# Altium schematic symbol library Schlib.SchLib: 725 symbols (part 1 of 6) (continued)
## 2309407-1
designator J?
260 Position SODIMM DDR4 SDRAM Socket Surface Mount, 25° Angle; Manufacturer: TE Connectivity; Manufacturer Part Number: 2309407-1; Supplier: Rs; Supplier Part Number: 1855885P; RoHS: Yes; Category: Memory Connectors; Stock: 175; Pricing: 25=1.41400, 50=1.35400, 100=1.24800 (GBP); ComponentLink1URL: https://www.te.com/commerce/DocumentDelivery/DDEController?Action=srchrtrv&DocNm=2309413&DocType=Customer+Drawing&DocLang=English&src-supplier=Digi-Key; ComponentLink1Description: https://www.te.com/commerce/DocumentDelivery/DDEController?Action=srchrtrv&DocNm=2309413&DocType=Customer+Drawing&DocLang=English&src-supplier=Digi-Key; ComponentLink2URL: https://www.te.com/commerce/DocumentDelivery/DDEController?Action=srchrtrv&amp;DocNm=2309413&amp;DocType=Customer+Drawing&amp;DocLang=English&src-supplier=Digi-Key; ComponentLink2Description: https://www.te.com/commerce/DocumentDelivery/DDEController?Action=srchrtrv&amp;DocNm=2309413&amp;DocType=Customer+Drawing&amp;DocLang=English&src-supplier=Digi-Key
footprint 2309407-1
part A pins: 1 GND, 2 GND, 7 GND, 8 GND, 13 GND, 14 GND, 19 GND, 20 GND, 25 GND, 26 GND, 31 GND, 32 GND, 37 GND, 38 GND, 43 GND, 44 GND, 49 GND, 50 GND, 55 GND, 56 GND, 61 GND, 62 GND, 67 GND, 68 GND, 73 GND, 74 GND, 79 GND, 80 GND, 85 GND, 86 GND, 99 UART0_TXD, 101 UART0_RXD, 102 GND, 103 UART0_RTS, 105 UART0_CTS, 107 GND, 113 GND, 119 GND, 125 GND, 129 GND, 132 GND, 135 GND, 138 GND, 141 GND, 143 (CAN_RX) RSVD, 144 GND, 145 (CAN_TX) RSVD, 146 GND, 147 GND, 152 GND, 153 GND, 158 GND, 159 GND, 164 GND, 165 GND, 170 GND, 171 GND, 176 GND, 177 GND, 178 MOD_SLEEP, 185 I2C0_SCL, 187 I2C0_SDA, 189 I2C1_SCL, 191 I2C1_SDA, 200 GND, 201 GND, 203 UART1_TXD, 205 UART1_RXD, 207 UART1_RTS, 209 UART1_CTS, 214 FOROE_RECOVERY, 217 GND, 231 GND, 232 I2C2_SCL, 233 SHUTDOWN_REQ, 234 I2C2_SDA, 235 PMI_BBAT, 236 (DEBUG) UART2_TXD, 237 POWER_EN, 238 (DEBUG) UART2_RXD, 239 SYS_RESET, 240 SLEEP/WAKE, 241 GND, 242 GND, 243 GND, 244 GND, 245 GND, 246 GND, 247 GND, 248 GND, 249 GND, 250 GND, 251 VDD_IN, 252 VDD_IN, 253 VDD_IN, 254 VDD_IN, 255 VDD_IN, 256 VDD_IN, 257 VDD_IN, 258 VDD_IN, 259 VDD_IN, 260 VDD_IN, MP1, MP2
part B pins: 3 CSI1_D0-, 4 CSI0_D0-, 5 CSI1_D0+, 6 CSI0_D0+, 9 (CSI1_CLK-) RSVD, 10 CSI0_CLK-, 11 (CSI1_CLK+) RSVD, 12 CSI0_CLK+, 15 CSI1_D1-, 16 CSI0_D1-, 17 CSI1_D1+, 18 CSI0_D1+, 21 CSI3_D0-, 22 CSI2_D0-, 23 CSI3_D0+, 24 CSI2_D0+, 27 CSI3_CLK-, 28 CSI2_CLK-, 29 CSI3_CLK+, 30 CSI2_CLK+, 33 CSI3_D1-, 34 CSI2_D1-, 35 CSI3_D1+, 36 CSI2_D1+, 40 CSI4_D2-, 42 CSI4_D2+, 46 CSI4_D0-, 48 CSI4_D0+, 52 CSI4_CLK-, 54 CSI4_CLK+, 58 CSI4_D1-, 60 CSI4_D1+, 64 CSI4_D3-, 66 CSI4_D3+, 87 GPIO00(USB_VBUS_EN0), 89 SPI0_MOSI, 91 SPI0_SCK, 93 SPI0_MISO, 95 SPI0_CS0, 97 SPI0_CS1, 104 SPI1_MOSI, 106 SPI_SCK, 108 SPI1_MISO, 109 USB0_D-, 110 SPI1_CS0, 111 USB0_D+, 112 SPI1_CS1, 114 CAM0_PWDN, 115 USB1_D-, 116 CAM0_MCLK, 117 USB1_D+, 118 GPIO01 (CLK), 120 CAM1_PWDN, 121 USB2_D-, 122 CAM1_MCLK, 123 USB2_D+, 124 GPIO02, 126 GPIO03, 127 GPIO04, 128 GPIO05, 130 GPIO06, 184 GBE_MDI 0-, 186 GBE_MDI 0+, 188 GBE_LED_LINK, 190 GBE_MDI 1-, 192 GBE_MDI 1+, 193 I2S0_DOUT, 194 GBE_LED_ACT, 195 I2S0_DIN, 196 GBE_MDI 2-, 197 I2S0_FS, 198 GBE_MDI 2+, 199 I2S0_SCLK, 202 GBE_MDI 3-, 204 GBE_MDI 3+, 206 GPIO07 (PWM), 208 GPIO08 (SDMMC_CD), 211 GPIO09 (AUD_MCLK), 212 GPIO10, 213 CAM_I2C_SCL, 215 CAM_I2C_SDA, 216 GPIO11 (CLK), 218 GPIO12, 219 SDMMC_DAT0, 220 I2S1_DOUT, 221 SDMMC_DAT1, 222 I2S1_DIN, 223 SDMMC_DAT2, 224 I2S1_FS, 225 SDMMC_DAT3, 226 I2S1_SCLK, 227 SDMMC_CMD, 228 GPIO13 (PWM), 229 SDMMC_CLK, 230 GPIO14 (PWM)
part C pins: 39 DP0_TXD0-, 41 DP0_TXD0+, 45 DP0_TXD1-, 47 DP0_TXD1+, 51 DP0_TXD2-, 53 DP0_TXD2+, 57 DP0_TXD3-, 59 DP0_TXD3+, 63 DP1_TXD0 (HDMI_TXD2)-, 65 DP1_TXD0 (HDMI_TXD2)+, 69 DP1_TXD1 (HDMI_TXD1)-, 70 DSI_D0-, 71 DP1_TXD1 (HDMI_TXD1)+, 72 DSI_D0+, 75 DP1_TXD2 (HDMI_TXD0)-, 76 DSI_CLK-, 77 DP1_TXD2 (HDMI_TXD0)+, 78 DSI_CLK+, 81 DP1_TXD3 (HDMI_TXC)-, 82 DSI_D1-, 83 DP1_TXD3 (HDMI_TXC)+, 84 DSI_D1+, 88 DP0_HPD, 90 DP0_AUX-, 92 DP0_AUX+, 94 HDMI_CEC, 96 DP1_HPD (HDMI_HPD), 98 DP1_AUX_N (HDMI_DDC_SDA), 100 DP1_AUX_P (HDMI_DDC_SCL), 131 PCIE0_RX0-, 133 PCIE0_RX0+, 134 PCIE0_TX0-, 136 PCIE0_TX0+, 137 PCIE0_RX1-, 139 PCIE0_RX1+, 140 PCIE0_TX1-, 142 PCIE0_TX1+, 148 PCIE0_TX2-, 149 PCIE0_RX2-, 150 PCIE0_TX2+, 151 PCIE0_RX2+, 154 PCIE0_TX3-, 155 PCIE0_RX3-, 156 PCIE0_TX3+, 157 PCIE0_RX3+, 160 PCIE0_CLK-, 161 USBSS_RX-, 162 PCIE0_CLK+, 163 USBSS_RX+, 166 USBSS_TX-, 167 (PCIE1_RX0) RSVD-, 168 USBSS_TX+, 169 (PCIE1_RX0) RSVD+, 172 (PCIE1_TX0) RSVD-, 173 (PCIE1_CLK) RSVD-, 174 (PCIE1_TX0) RSVD+, 175 (PCIE1_CLK) RSVD+, 179 PCIE_WAKE, 180 PCIE0_CLKREQ, 181 PCIE0_RST, 182 (PCIE1_CLKREQ) RSVD, 183 (PCIE1_RST) RSVD, 210 CLK_32K_OUT
part A text: UART, I2C, CAN and GPIOs
part B text: GPIOs, USB2.0, I2S, SPI, GBe and CSI
part C text: HDMI, DP, DSI, USBSS and PCIe

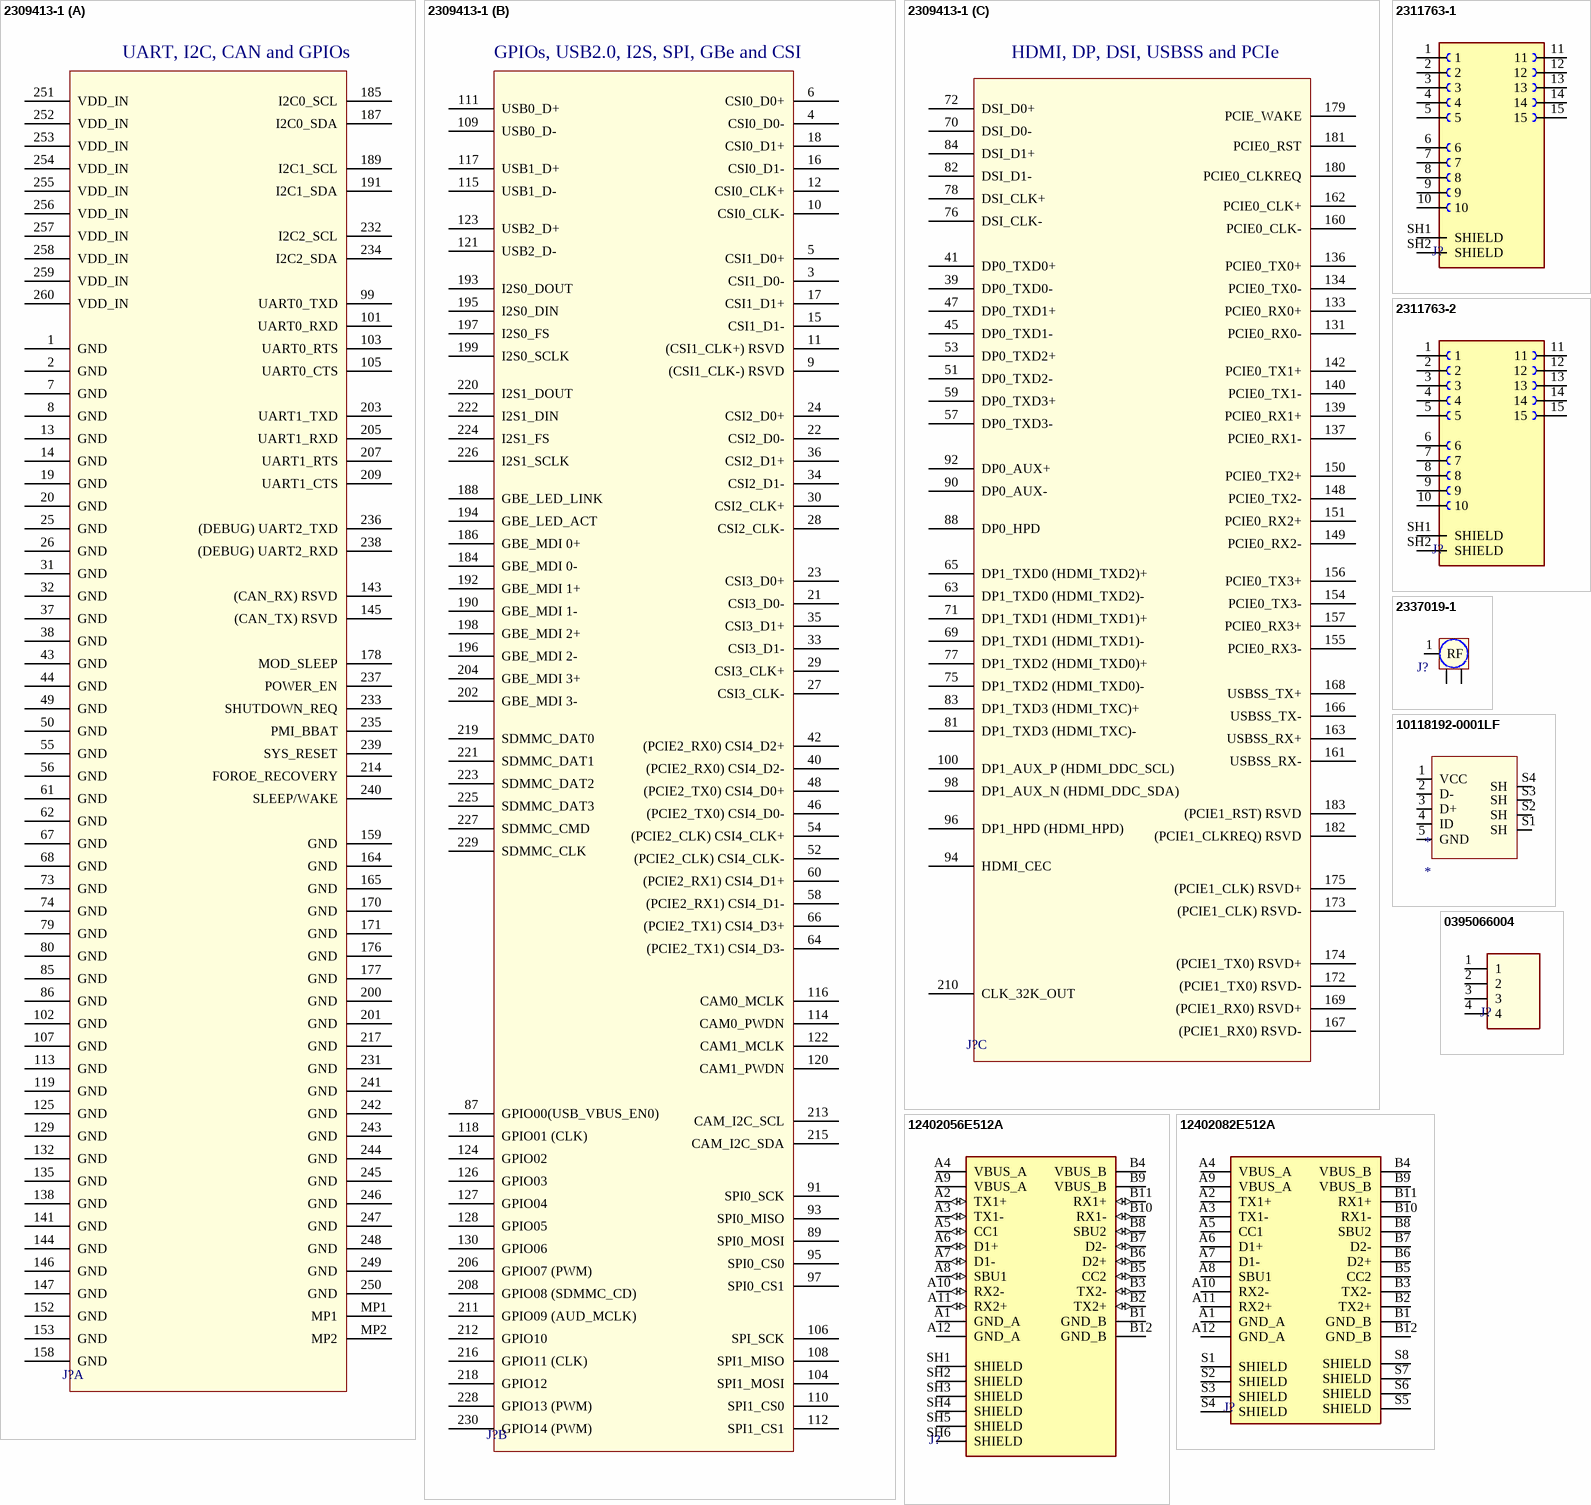
[diagram p3: symbols 2309413-1 to 0395066004]

## 2309413-1
designator J?
Conn DDR4 DIMM Socket SKT 260 POS 0.5mm Solder RA SMD T/R; Manufacturer: TE Connectivity; Manufacturer Part Number: 2309413-1; Supplier: Rs; Supplier Part Number: 1855885P; RoHS: Yes; Category: Memory Connectors; Stock: 175; Pricing: 25=1.41400, 50=1.35400, 100=1.24800 (GBP); ComponentLink1URL: https://www.te.com/commerce/DocumentDelivery/DDEController?Action=srchrtrv&DocNm=2309413&DocType=Customer+Drawing&DocLang=English&src-supplier=Digi-Key; ComponentLink1Description: https://www.te.com/commerce/DocumentDelivery/DDEController?Action=srchrtrv&DocNm=2309413&DocType=Customer+Drawing&DocLang=English&src-supplier=Digi-Key; ComponentLink2URL: https://www.te.com/commerce/DocumentDelivery/DDEController?Action=srchrtrv&amp;DocNm=2309413&amp;DocType=Customer+Drawing&amp;DocLang=English&src-supplier=Digi-Key; ComponentLink2Description: https://www.te.com/commerce/DocumentDelivery/DDEController?Action=srchrtrv&amp;DocNm=2309413&amp;DocType=Customer+Drawing&amp;DocLang=English&src-supplier=Digi-Key
footprint 23094131
part A pins: 1 GND, 2 GND, 7 GND, 8 GND, 13 GND, 14 GND, 19 GND, 20 GND, 25 GND, 26 GND, 31 GND, 32 GND, 37 GND, 38 GND, 43 GND, 44 GND, 49 GND, 50 GND, 55 GND, 56 GND, 61 GND, 62 GND, 67 GND, 68 GND, 73 GND, 74 GND, 79 GND, 80 GND, 85 GND, 86 GND, 99 UART0_TXD, 101 UART0_RXD, 102 GND, 103 UART0_RTS, 105 UART0_CTS, 107 GND, 113 GND, 119 GND, 125 GND, 129 GND, 132 GND, 135 GND, 138 GND, 141 GND, 143 (CAN_RX) RSVD, 144 GND, 145 (CAN_TX) RSVD, 146 GND, 147 GND, 152 GND, 153 GND, 158 GND, 159 GND, 164 GND, 165 GND, 170 GND, 171 GND, 176 GND, 177 GND, 178 MOD_SLEEP, 185 I2C0_SCL, 187 I2C0_SDA, 189 I2C1_SCL, 191 I2C1_SDA, 200 GND, 201 GND, 203 UART1_TXD, 205 UART1_RXD, 207 UART1_RTS, 209 UART1_CTS, 214 FOROE_RECOVERY, 217 GND, 231 GND, 232 I2C2_SCL, 233 SHUTDOWN_REQ, 234 I2C2_SDA, 235 PMI_BBAT, 236 (DEBUG) UART2_TXD, 237 POWER_EN, 238 (DEBUG) UART2_RXD, 239 SYS_RESET, 240 SLEEP/WAKE, 241 GND, 242 GND, 243 GND, 244 GND, 245 GND, 246 GND, 247 GND, 248 GND, 249 GND, 250 GND, 251 VDD_IN, 252 VDD_IN, 253 VDD_IN, 254 VDD_IN, 255 VDD_IN, 256 VDD_IN, 257 VDD_IN, 258 VDD_IN, 259 VDD_IN, 260 VDD_IN, MP1, MP2
part B pins: 3 CSI1_D0-, 4 CSI0_D0-, 5 CSI1_D0+, 6 CSI0_D0+, 9 (CSI1_CLK-) RSVD, 10 CSI0_CLK-, 11 (CSI1_CLK+) RSVD, 12 CSI0_CLK+, 15 CSI1_D1-, 16 CSI0_D1-, 17 CSI1_D1+, 18 CSI0_D1+, 21 CSI3_D0-, 22 CSI2_D0-, 23 CSI3_D0+, 24 CSI2_D0+, 27 CSI3_CLK-, 28 CSI2_CLK-, 29 CSI3_CLK+, 30 CSI2_CLK+, 33 CSI3_D1-, 34 CSI2_D1-, 35 CSI3_D1+, 36 CSI2_D1+, 40 (PCIE2_RX0) CSI4_D2-, 42 (PCIE2_RX0) CSI4_D2+, 46 (PCIE2_TX0) CSI4_D0-, 48 (PCIE2_TX0) CSI4_D0+, 52 (PCIE2_CLK) CSI4_CLK-, 54 (PCIE2_CLK) CSI4_CLK+, 58 (PCIE2_RX1) CSI4_D1-, 60 (PCIE2_RX1) CSI4_D1+, 64 (PCIE2_TX1) CSI4_D3-, 66 (PCIE2_TX1) CSI4_D3+, 87 GPIO00(USB_VBUS_EN0), 89 SPI0_MOSI, 91 SPI0_SCK, 93 SPI0_MISO, 95 SPI0_CS0, 97 SPI0_CS1, 104 SPI1_MOSI, 106 SPI_SCK, 108 SPI1_MISO, 109 USB0_D-, 110 SPI1_CS0, 111 USB0_D+, 112 SPI1_CS1, 114 CAM0_PWDN, 115 USB1_D-, 116 CAM0_MCLK, 117 USB1_D+, 118 GPIO01 (CLK), 120 CAM1_PWDN, 121 USB2_D-, 122 CAM1_MCLK, 123 USB2_D+, 124 GPIO02, 126 GPIO03, 127 GPIO04, 128 GPIO05, 130 GPIO06, 184 GBE_MDI 0-, 186 GBE_MDI 0+, 188 GBE_LED_LINK, 190 GBE_MDI 1-, 192 GBE_MDI 1+, 193 I2S0_DOUT, 194 GBE_LED_ACT, 195 I2S0_DIN, 196 GBE_MDI 2-, 197 I2S0_FS, 198 GBE_MDI 2+, 199 I2S0_SCLK, 202 GBE_MDI 3-, 204 GBE_MDI 3+, 206 GPIO07 (PWM), 208 GPIO08 (SDMMC_CD), 211 GPIO09 (AUD_MCLK), 212 GPIO10, 213 CAM_I2C_SCL, 215 CAM_I2C_SDA, 216 GPIO11 (CLK), 218 GPIO12, 219 SDMMC_DAT0, 220 I2S1_DOUT, 221 SDMMC_DAT1, 222 I2S1_DIN, 223 SDMMC_DAT2, 224 I2S1_FS, 225 SDMMC_DAT3, 226 I2S1_SCLK, 227 SDMMC_CMD, 228 GPIO13 (PWM), 229 SDMMC_CLK, 230 GPIO14 (PWM)
part C pins: 39 DP0_TXD0-, 41 DP0_TXD0+, 45 DP0_TXD1-, 47 DP0_TXD1+, 51 DP0_TXD2-, 53 DP0_TXD2+, 57 DP0_TXD3-, 59 DP0_TXD3+, 63 DP1_TXD0 (HDMI_TXD2)-, 65 DP1_TXD0 (HDMI_TXD2)+, 69 DP1_TXD1 (HDMI_TXD1)-, 70 DSI_D0-, 71 DP1_TXD1 (HDMI_TXD1)+, 72 DSI_D0+, 75 DP1_TXD2 (HDMI_TXD0)-, 76 DSI_CLK-, 77 DP1_TXD2 (HDMI_TXD0)+, 78 DSI_CLK+, 81 DP1_TXD3 (HDMI_TXC)-, 82 DSI_D1-, 83 DP1_TXD3 (HDMI_TXC)+, 84 DSI_D1+, 88 DP0_HPD, 90 DP0_AUX-, 92 DP0_AUX+, 94 HDMI_CEC, 96 DP1_HPD (HDMI_HPD), 98 DP1_AUX_N (HDMI_DDC_SDA), 100 DP1_AUX_P (HDMI_DDC_SCL), 131 PCIE0_RX0-, 133 PCIE0_RX0+, 134 PCIE0_TX0-, 136 PCIE0_TX0+, 137 PCIE0_RX1-, 139 PCIE0_RX1+, 140 PCIE0_TX1-, 142 PCIE0_TX1+, 148 PCIE0_TX2-, 149 PCIE0_RX2-, 150 PCIE0_TX2+, 151 PCIE0_RX2+, 154 PCIE0_TX3-, 155 PCIE0_RX3-, 156 PCIE0_TX3+, 157 PCIE0_RX3+, 160 PCIE0_CLK-, 161 USBSS_RX-, 162 PCIE0_CLK+, 163 USBSS_RX+, 166 USBSS_TX-, 167 (PCIE1_RX0) RSVD-, 168 USBSS_TX+, 169 (PCIE1_RX0) RSVD+, 172 (PCIE1_TX0) RSVD-, 173 (PCIE1_CLK) RSVD-, 174 (PCIE1_TX0) RSVD+, 175 (PCIE1_CLK) RSVD+, 179 PCIE_WAKE, 180 PCIE0_CLKREQ, 181 PCIE0_RST, 182 (PCIE1_CLKREQ) RSVD, 183 (PCIE1_RST) RSVD, 210 CLK_32K_OUT
part A text: UART, I2C, CAN and GPIOs
part B text: GPIOs, USB2.0, I2S, SPI, GBe and CSI
part C text: HDMI, DP, DSI, USBSS and PCIe

## 2311763-1
designator J?  (value not drawn)
D-Sub connector, 15 pole, standard, angled, solder pin, 2311763-1; Manufacturer: TE Connectivity AMP; Gender: 4472Gender; Supplier: Farnell; Supplier Part Number: 4310053; Manufacturer Part Number: 2311763-1; RoHS: Yes; Category: D-Sub Connectors; Stock: 1114; Pricing: 20=4.24, 60=4.07 (EUR); Housing Color: 46Colour; ComponentLink1URL: https://www.te.com/commerce/DocumentDelivery/DDEController?Action=srchrtrv&amp;DocNm=2311763&amp;DocType=Customer+Drawing&amp;DocLang=English&src-supplier=Digikey; ComponentLink1Description: https://www.te.com/commerce/DocumentDelivery/DDEController?Action=srchrtrv&amp;DocNm=2311763&amp;DocType=Customer+Drawing&amp;DocLang=English&src-supplier=Digikey; ComponentLink2URL: https://datasheet.octopart.com/2311763-1-TE-Connectivity-datasheet-136945280.pdf?src-supplier=Master+Electronics; ComponentLink2Description: https://datasheet.octopart.com/2311763-1-TE-Connectivity-datasheet-136945280.pdf?src-supplier=Master+Electronics
footprint 2311763-1
pins: 1, 2, 3, 4, 5, 6, 7, 8, 9, 10, 11, 12, 13, 14, 15, SH1 SHIELD, SH2 SHIELD

## 2311763-2
designator J?  (value not drawn)
AMPL REC, HD22, R/A, 15P, THREADED, PCB D-Sub Connectors | TE Connectivity 2311763-2; Manufacturer: TE Connectivity AMP; Gender: 4472Gender; Supplier: Onlinecomponents.com; Supplier Part Number: 2311763-2; Manufacturer Part Number: 2311763-2; RoHS: Yes; Category: D-Sub Connectors; Stock: 4018; Pricing: 90=3.02, 180=2.989, 270=2.742, 540=2.556, 1080=2.332, 2520=2.308, 5040=2.285, 7560=2.262 (USD); Housing Color: 46Colour; ComponentLink1URL: https://www.te.com/commerce/DocumentDelivery/DDEController?Action=srchrtrv&amp;DocNm=2311763&amp;DocType=Customer+Drawing&amp;DocLang=English&src-supplier=Digikey; ComponentLink1Description: https://www.te.com/commerce/DocumentDelivery/DDEController?Action=srchrtrv&amp;DocNm=2311763&amp;DocType=Customer+Drawing&amp;DocLang=English&src-supplier=Digikey; ComponentLink2URL: https://datasheet.octopart.com/2311763-2-TE-Connectivity---AMP-datasheet-154801792.pdf?src-supplier=Master+Electronics; ComponentLink2Description: https://datasheet.octopart.com/2311763-2-TE-Connectivity---AMP-datasheet-154801792.pdf?src-supplier=Master+Electronics
footprint 2311763-2
pins: 1, 2, 3, 4, 5, 6, 7, 8, 9, 10, 11, 12, 13, 14, 15, SH1 SHIELD, SH2 SHIELD

## 2337019-1
designator J?  (value not drawn)
RF Connector; Coaxial Connectors MicroCoax receptacle UMCC Gen 1; Manufacturer: TE Connectivity; Manufacturer Part Number: 2337019-1; Body Material: Copper Alloy; Center Contact Plating: Gold; Dielectric Material: Thermoplastic; Connector Type: Receptacle,Male Pin; Impedance: 50R; Clock Frequency: 6GHz; Number of Ports: 1; Supplier: Rs; Supplier Part Number: 1888357; RoHS: Yes; Category: RF / Coaxial Connectors; Stock: 10300; Pricing: 10000=0.074, 30000=0.074 (GBP); Mounting Technology: Surface Mount; Contact Material: Copper Alloy; Min Operating Temperature: -40°C; Max Operating Temperature: 85°C; Series: -; Packaging: Cut Tape; Termination: Solder; ComponentLink1URL: https://www.te.com/commerce/DocumentDelivery/DDEController?Action=srchrtrv&amp;DocNm=C-2337019&amp;DocType=Customer+Drawing&amp;DocLang=English&src-supplier=Digi-Key; ComponentLink1Description: https://www.te.com/commerce/DocumentDelivery/DDEController?Action=srchrtrv&amp;DocNm=C-2337019&amp;DocType=Customer+Drawing&amp;DocLang=English&src-supplier=Digi-Key; ComponentLink2URL: https://datasheet.octopart.com/2337019-1-TE-Connectivity-datasheet-169146699.pdf?src-supplier=Sager+Electronics; ComponentLink2Description: https://datasheet.octopart.com/2337019-1-TE-Connectivity-datasheet-169146699.pdf?src-supplier=Sager+Electronics
footprint 2337019-1
pins: 1 RF, G1 GND, G2 GND

## 10118192-0001LF
designator *
CONN USB MICRO B RECPT SMT R/A; Manufacturer: Amphenol ICC / FCI; Manufacturer Part Number: 10118192-0001LF; Gender: Receptacle; Connector Type: USB,Receptacle; USB Standard: USB 2.0; Number of Contacts: 5; Current Rating: 1.8A; Insulation Resistance: 1GR; Number of Ports: 1; Max Voltage Rating (AC): 100V; Pitch: 0.65mm; Supplier: Rs; Supplier Part Number: 1822981; RoHS: No; Category: Uncategorized; Stock: 3280; Pricing: 10=0.279, 100=0.268, 250=0.254, 500=0.234, 1000=0.223 (GBP); Mounting Technology: Surface Mount,Horizontal; Pins: 5; Color: Black; Contact Material: Copper Alloy; Contact Plating: Gold; Housing Material: Polymer; Min Operating Temperature: -55°C; Max Operating Temperature: 85°C; Orientation: Right Angle; Termination: Solder; Features: Shielded; Voltage Rating: 100V; Series: -; Packaging: Tape and Reel; Package Quantity: 1400; Length: 7.86mm; Depth: 5.57mm; Radiation Hardening: No; Flammability Rating: UL94 V-0; Reach SVHC Compliant: No; ComponentLink1URL: http://uk.rs-online.com/webdocs/1450/0900766b814507ee.pdf?src-supplier=Rs; ComponentLink1Description: http://uk.rs-online.com/webdocs/1450/0900766b814507ee.pdf?src-supplier=Rs; ComponentLink2URL: https://cdn.amphenol-icc.com/media/wysiwyg/files/documentation/datasheet/inputoutput/io_usb_micro.pdf?src-supplier=Verical; ComponentLink2Description: https://cdn.amphenol-icc.com/media/wysiwyg/files/documentation/datasheet/inputoutput/io_usb_micro.pdf?src-supplier=Verical; ComponentLink3URL: https://cdn.amphenol-icc.com/media/wysiwyg/files/documentation/datasheet/inputoutput/io_usb_micro.pdf?src-supplier=Allied+Electronics; ComponentLink3Description: https://cdn.amphenol-icc.com/media/wysiwyg/files/documentation/datasheet/inputoutput/io_usb_micro.pdf?src-supplier=Allied+Electronics; ComponentLink4URL: http://www.farnell.com/datasheets/2366786.pdf?src-supplier=Newark; ComponentLink4Description: http://www.farnell.com/datasheets/2366786.pdf?src-supplier=Newark; ComponentLink5URL: https://cdn.amphenol-icc.com/media/wysiwyg/files/documentation/datasheet/inputoutput/io_usb_micro.pdf?src-supplier=Mouser; ComponentLink5Description: https://cdn.amphenol-icc.com/media/wysiwyg/files/documentation/datasheet/inputoutput/io_usb_micro.pdf?src-supplier=Mouser; ComponentLink6URL: http://www.amphenol-icc.com/media/wysiwyg/files/drawing/10118192.pdf?src-supplier=Digi-Key; ComponentLink6Description: http://www.amphenol-icc.com/media/wysiwyg/files/drawing/10118192.pdf?src-supplier=Digi-Key; ComponentLink7URL: https://datasheet.octopart.com/10118192-0001LF-Amphenol-Communications-Solutions-datasheet-96019471.pdf?src-supplier=Element14; ComponentLink7Description: https://datasheet.octopart.com/10118192-0001LF-Amphenol-Communications-Solutions-datasheet-96019471.pdf?src-supplier=Element14; ComponentLink8URL: http://www.farnell.com/datasheets/2366786.pdf?src-supplier=Farnell; ComponentLink8Description: http://www.farnell.com/datasheets/2366786.pdf?src-supplier=Farnell; ComponentLink9URL: http://www.farnell.com/cad/1935767.pdf?src-supplier=Element14; ComponentLink9Description: http://www.farnell.com/cad/1935767.pdf?src-supplier=Element14; ComponentLink10URL: https://cdn.amphenol-icc.com/media/wysiwyg/files/documentation/datasheet/inputoutput/io_usb_micro.pdf?src-supplier=Arrow+Electronics; ComponentLink10Description: https://cdn.amphenol-icc.com/media/wysiwyg/files/documentation/datasheet/inputoutput/io_usb_micro.pdf?src-supplier=Arrow+Electronics; ComponentLink11URL: https://cdn.amphenol-icc.com/media/wysiwyg/files/documentation/datasheet/inputoutput/io_usb_micro.pdf?src-supplier=Avnet; ComponentLink11Description: https://cdn.amphenol-icc.com/media/wysiwyg/files/documentation/datasheet/inputoutput/io_usb_micro.pdf?src-supplier=Avnet; ComponentLink12URL: https://cdn.amphenol-icc.com/media/wysiwyg/files/documentation/datasheet/inputoutput/io_usb_micro.pdf?src-supplier=TME; ComponentLink12Description: https://cdn.amphenol-icc.com/media/wysiwyg/files/documentation/datasheet/inputoutput/io_usb_micro.pdf?src-supplier=TME; ComponentLink13URL: https://cdn.amphenol-icc.com/media/wysiwyg/files/documentation/datasheet/inputoutput/io_usb_micro.pdf?src-supplier=TTI; ComponentLink13Description: https://cdn.amphenol-icc.com/media/wysiwyg/files/documentation/datasheet/inputoutput/io_usb_micro.pdf?src-supplier=TTI; ComponentLink14URL: https://cdn.amphenol-icc.com/media/wysiwyg/files/documentation/datasheet/inputoutput/io_usb_micro.pdf?src-supplier=NAC+Semi; ComponentLink14Description: https://cdn.amphenol-icc.com/media/wysiwyg/files/documentation/datasheet/inputoutput/io_usb_micro.pdf?src-supplier=NAC+Semi; ComponentLink15URL: https://cdn.amphenol-icc.com/media/wysiwyg/files/documentation/datasheet/inputoutput/io_usb_micro.pdf?src-supplier=SOS+electronic; ComponentLink15Description: https://cdn.amphenol-icc.com/media/wysiwyg/files/documentation/datasheet/inputoutput/io_usb_micro.pdf?src-supplier=SOS+electronic; ComponentLink16URL: https://datasheet.octopart.com/10118192-0001LF-Amphenol-Communications-Solutions-datasheet-55953129.pdf?src-supplier=Electro+Sonic; ComponentLink16Description: https://datasheet.octopart.com/10118192-0001LF-Amphenol-Communications-Solutions-datasheet-55953129.pdf?src-supplier=Electro+Sonic; ComponentLink17URL: https://cdn.amphenol-icc.com/media/wysiwyg/files/documentation/datasheet/inputoutput/io_usb_micro.pdf?src-supplier=Freelance+Electronics; ComponentLink17Description: https://cdn.amphenol-icc.com/media/wysiwyg/files/documentation/datasheet/inputoutput/io_usb_micro.pdf?src-supplier=Freelance+Electronics; ComponentLink18URL: https://cdn.amphenol-icc.com/media/wysiwyg/files/documentation/datasheet/inputoutput/io_usb_micro.pdf?src-supplier=Heilind+Electronics; ComponentLink18Description: https://cdn.amphenol-icc.com/media/wysiwyg/files/documentation/datasheet/inputoutput/io_usb_micro.pdf?src-supplier=Heilind+Electronics
pins: 1 VCC, 2 D-, 3 D+, 4 ID, 5 GND, S1 SH, S2 SH, S3 SH, S4 SH

## 12402056E512A
designator J?
USB Connector, 24 Contact(s), Female, Right Angle, Surface Mount Terminal, Locking, Socket; Manufacturer: Amphenol; Manufacturer Part Number: 12402056E512A; Contact Resistance: 40mΩ; Current Rating: 5A; Dielectric Material: Polyethylene; Insulation Resistance: 100MΩ; Number of Ports: 1; Plating Thickness: 762nm; Row Spacing: 1.65mm; Supplier: Arrow Electronics; Supplier Part Number: 12402056E512A; RoHS: Compliant; Category: USB Connectors; Stock: 16000; Pricing: 8000=0.3814 (USD); Contact Gender: Female; Export Control Classification Number (ECCN) Code: EAR99; Harmonized Tariff Schedule (HTS) Code: 8536.69.40.30; Introduction Date: 2020-10-14; Lifecycle Status: Production; Max Operating Temperature: 85°C; Min Operating Temperature: -40°C; Pins: 24; Number of Rows: 2; REACH SVHC: Yes; Shell Finish: Nickel; Shell Material: Stainless Steel; Terminal Pitch: 500µm; ComponentLink1URL: https://datasheet.octopart.com:443/12402056E512A-Amphenol-Communications-Solutions-datasheet-182242350.pdf?src-supplier=IHS; ComponentLink1Description: https://datasheet.octopart.com:443/12402056E512A-Amphenol-Communications-Solutions-datasheet-182242350.pdf?src-supplier=IHS
footprint AMPHENOL_12402056E512A
pins: A1 GND_A (power), A2 TX1+ (io), A3 TX1- (io), A4 VBUS_A (power), A5 CC1 (io), A6 D1+ (io), A7 D1- (io), A8 SBU1 (io), A9 VBUS_A (power), A10 RX2- (io), A11 RX2+ (io), A12 GND_A (power), B1 GND_B (power), B2 TX2+ (io), B3 TX2- (io), B4 VBUS_B (power), B5 CC2 (io), B6 D2+ (io), B7 D2- (io), B8 SBU2 (io), B9 VBUS_B (power), B10 RX1- (io), B11 RX1+ (io), B12 GND_B (power), SH1 SHIELD, SH2 SHIELD, SH3 SHIELD, SH4 SHIELD, SH5 SHIELD, SH6 SHIELD

## 12402082E512A
designator J?  (value not drawn)
USB-C (USB TYPE-C) USB 4.0 Receptacle Connector 24 Position Surface Mount, Throu; Manufacturer: Amphenol; Manufacturer Part Number: 12402082E512A; Current Rating: 5A; Number of Contacts: 24NUMBER; Voltage Rating: 20V; Supplier: Arrow Electronics; Supplier Part Number: 12402082E512A; RoHS: No; Category: Connectors; Stock: 961; Pricing: 1=3.503, 10=3.176, 25=3.027, 100=2.904, 250=2.072 (USD); Contact Material: 153,157ConductorMaterial; Min Operating Temperature: -40°C; Max Operating Temperature: 85°C; Height: 7.75mm
footprint 12402082E512A
pins: A1 GND_A, A2 TX1+, A3 TX1-, A4 VBUS_A, A5 CC1, A6 D1+, A7 D1-, A8 SBU1, A9 VBUS_A, A10 RX2-, A11 RX2+, A12 GND_A, B1 GND_B, B2 TX2+, B3 TX2-, B4 VBUS_B, B5 CC2, B6 D2+, B7 D2-, B8 SBU2, B9 VBUS_B, B10 RX1-, B11 RX1+, B12 GND_B, S1 SHIELD, S2 SHIELD, S3 SHIELD, S4 SHIELD, S5 SHIELD, S6 SHIELD, S7 SHIELD, S8 SHIELD

## 0395066004
designator J?  (value not drawn)
3.50mm Pitch Eurostyle Horizontal PCB Header, with Threaded Retention Inserts, Green Housing, 4 Circuits; Manufacturer: Molex; Manufacturer Part Number: 0395066004; Number of Positions: 4; Number of Levels: 1; Current: 8A; Voltage: 300V; Pitch: 0.138inch; Supplier: Mouser; Supplier Part Number: 538-39506-6004; RoHS: Yes; Category: Uncategorized; Stock: 2419; Pricing: 1=1.84, 10=1.29, 50=1.29, 100=1.09, 1000=0.778, 10000=0.688 (USD); Mounting Technology: Through Hole; Color: Green; Min Operating Temperature: -40°C; Max Operating Temperature: 105°C; Package Quantity: 520; Number of Rows: 1; Packaging: Bulk; Termination: Solder; Series: Eurostyle™ ESE 39506; Number of Positions Per Level: 4; ComponentLink1URL: https://datasheet.ciiva.com/29681/395066002-sd-29681926.pdf?src-supplier=Digikey; ComponentLink1Description: https://datasheet.ciiva.com/29681/395066002-sd-29681926.pdf?src-supplier=Digikey; ComponentLink2URL: https://datasheet.ciiva.com/30040/395061506-sd-30040263.pdf?src-supplier=Avnet; ComponentLink2Description: https://datasheet.ciiva.com/30040/395061506-sd-30040263.pdf?src-supplier=Avnet
footprint 0395066004
pins: 1, 2, 3, 4

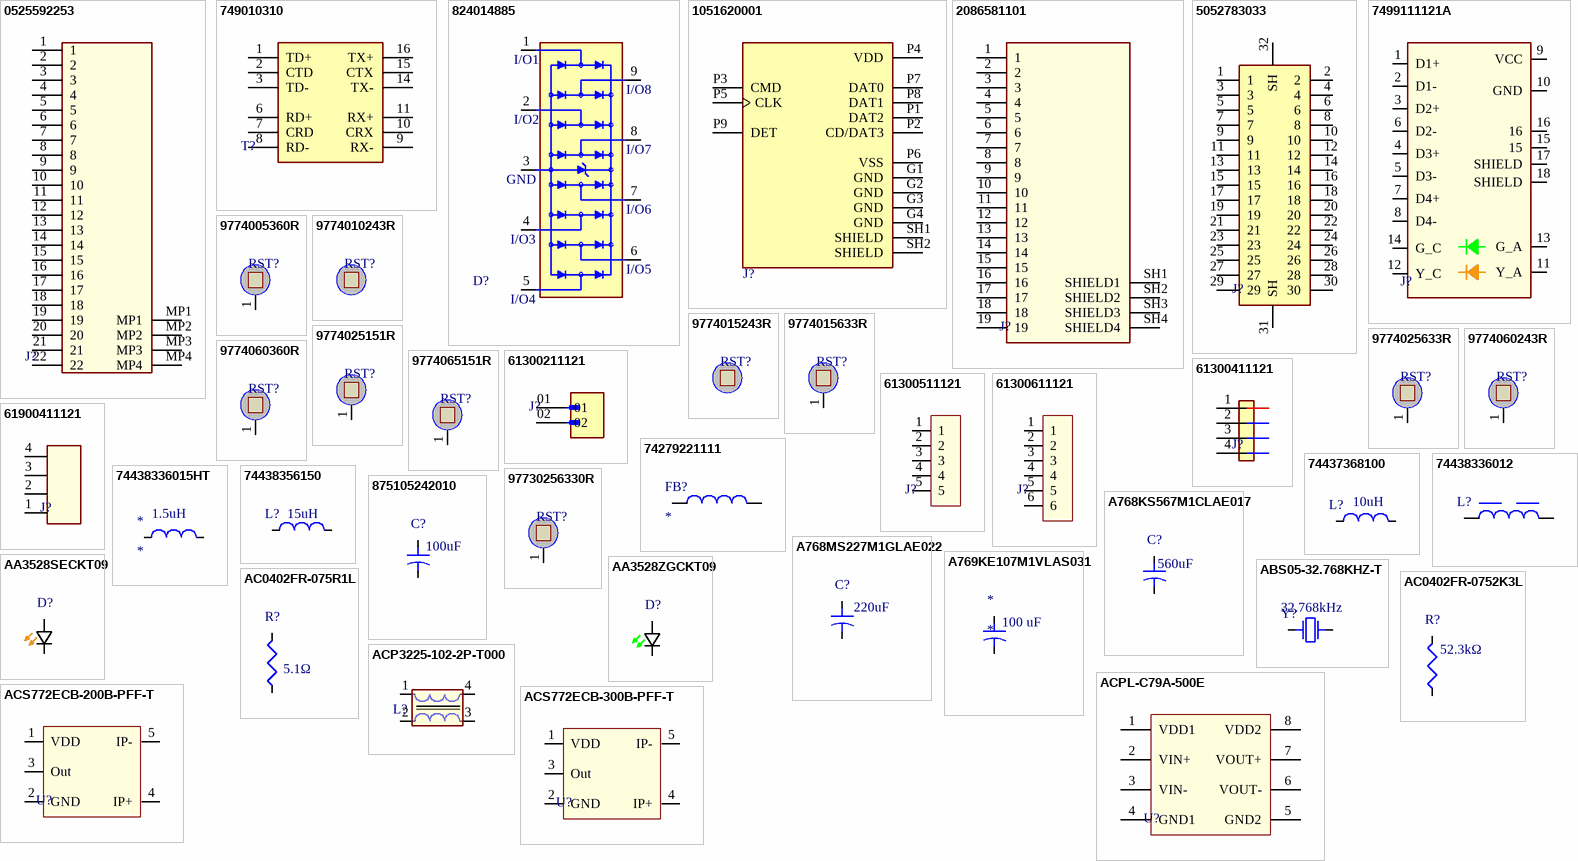
[diagram p4: symbols 0525592253 to ACS772ECB-300B-PFF-T]

## 0525592253
designator J?  (value not drawn)
Easy-On Type FFC/FPC Connector Vertical Surface Mount ZIF 22 Circuits Gold (Au) Contact Plating; Manufacturer: Molex; Manufacturer Part Number: 0525592253; Current Rating: 500mA; Voltage Rating: 50V; Number of Positions: 22; Contact Resistance: 20mR; Wire/Cable Type: Straight; Pitch: 1mm; Supplier: Mouser; Supplier Part Number: 538-52559-2253; RoHS: Yes; Category: Uncategorized; Stock: 2493; Pricing: 1=2.42, 10=2.2, 50=2.2, 100=1.86, 1000=1.66, 10000=1.55 (USD); Mounting Technology: Surface Mount; Contact Material: Bronze; Contact Plating: Gold; Housing Material: Nylon; Housing Color: Natural; Min Operating Temperature: -40°C; Max Operating Temperature: 85°C; Number of Rows: 1; Packaging: Tape and Reel; Package Quantity: 1000; Termination: Solder; Number of Contacts: 22; Orientation: Straight; Series: 52559; Length: 16.7mm; Depth: 3mm; Radiation Hardening: No; RoHS Compliant: Yes; ComponentLink1URL: https://datasheet.ciiva.com/2944/525591653-sd-2944969.pdf?src-supplier=Digi-Key; ComponentLink1Description: https://datasheet.ciiva.com/2944/525591653-sd-2944969.pdf?src-supplier=Digi-Key; ComponentLink2URL: https://datasheet.ciiva.com/10366/0525592253-ffc-fpc-connectors-10366518.pdf?src-supplier=Avnet; ComponentLink2Description: https://datasheet.ciiva.com/10366/0525592253-ffc-fpc-connectors-10366518.pdf?src-supplier=Avnet
footprint 0525592253 - duplicate
pins: 1, 2, 3, 4, 5, 6, 7, 8, 9, 10, 11, 12, 13, 14, 15, 16, 17, 18, 19, 20, 21, 22, MP1, MP2, MP3, MP4

## 749010310
designator T?
WE-LAN AQ 10/100 Base-T SMT Transformer 1 Port; Manufacturer: Wurth Elektronik; Manufacturer Part Number: 749010310; DC Resistance (DCR): 1.2Ω; Value: 350µH; Insertion Loss (dB): -1.1dB; Pitch: 1.27mm; Supplier: RS; Supplier Part Number: 1683246; RoHS: Compliant; Category: Uncategorized; Stock: 9; Pricing: 1=3.94, 50=3.51, 100=3.11, 250=2.81, 500=2.51 (GBP); Height: 4.25mm; Length: 12.7mm; Max Operating Temperature: 85°C; Min Operating Temperature: -40°C; Pins: 16; Width: 8.67mm; ComponentLink1URL: https://datasheet.octopart.com:443/749010310-Wurth-Elektronik-datasheet-168496254.pdf?src-supplier=Wurth+Elektronik; ComponentLink1Description: https://datasheet.octopart.com:443/749010310-Wurth-Elektronik-datasheet-168496254.pdf?src-supplier=Wurth+Elektronik; ComponentLink2URL: https://datasheet.octopart.com:443/749010310-W%C3%BCrth-Elektronik-datasheet-90986392.pdf?src-supplier=Newark; ComponentLink2Description: https://datasheet.octopart.com:443/749010310-W%C3%BCrth-Elektronik-datasheet-90986392.pdf?src-supplier=Newark
footprint 749010310 (10/100 Base-T SMD Transformer 1 Port, body 12.95x8.92mm)
pins: 1 TD+, 2 CTD, 3 TD-, 6 RD+, 7 CRD, 8 RD-, 9 RX-, 10 CRX, 11 RX+, 14 TX-, 15 CTX, 16 TX+

## 824014885
designator D?
Tvs Diode, Unidir, 10.5V, DFN3810 Rohs Compliant: Yes; Manufacturer: Wurth Elektronik; Manufacturer Part Number: 824014885; Forward Voltage: 900mV; Supplier: Mouser; Supplier Part Number: 710-824014885; RoHS: Compliant; Category: TVS Diodes; Stock: 2889; Pricing: 1=1.26, 10=1.15, 50=1.15, 100=1.03, 1000=0.811, 10000=0.682 (USD); Height: 500µm; Length: 3.8mm; Max Operating Temperature: 85°C; Min Operating Temperature: -55°C; Width: 1mm; ComponentLink1URL: https://datasheet.octopart.com:443/824014885-Wurth-Elektronik-datasheet-168501576.pdf?src-supplier=Farnell; ComponentLink1Description: https://datasheet.octopart.com:443/824014885-Wurth-Elektronik-datasheet-168501576.pdf?src-supplier=Farnell
footprint WE-TVS_DFN3810-9L
pins: 1, 2, 3 GND, 4, 5, 6, 7, 8, 9
text: I/O1; I/O8; I/O2; I/O7; I/O6; I/O3; I/O5; I/O4

## 1051620001
designator J?  (value not drawn)
Conn Micro SD Card HDR 8 POS 1.09mm Solder RA SMD 0.5A/Contact Embossed T/R; Manufacturer: Molex; Manufacturer Part Number: 1051620001; Connector Type: Connector; Max Voltage Rating (DC): 5V; Number of Circuits: 8; Supplier 1: Digikey; RoHS: Yes; Category: Memory Connectors; Stock 1: 43165; Pricing 1: 1=1.03, 10=0.852, 100=0.7098, 1000=0.56786 (USD); Mount: Surface Mount; Contact Material: Bronze; Contact Plating: Gold; Housing Material: Thermoplastic; Min Operating Temperature: -40°C; Max Operating Temperature: 85°C; Packaging: Tape and Reel; Number of Rows: 1; Termination: Solder; Orientation: Right Angle; Package Quantity: 6000; Series: 105162; Length: 11.3mm; Depth: 7.6mm; RoHS Compliant: Yes; ComponentLink1URL: https://datasheet.ciiva.com/29723/1051620101-sd-29723393.pdf?src-supplier=Digikey; ComponentLink1Description: https://datasheet.ciiva.com/29723/1051620101-sd-29723393.pdf?src-supplier=Digikey; Supplier Part Number 1: WM14405CT-ND
footprint 1051620001 (Footprint not found)
pins: G1 GND, G2 GND, G3 GND, G4 GND, P1 DAT2, P2 CD/DAT3, P3 CMD, P4 VDD, P5 CLK, P6 VSS, P7 DAT0, P8 DAT1, P9 DET, SH1 SHIELD, SH2 SHIELD

## 2086581101
designator J?  (value not drawn)
Connector, HDMI, .5mm, v2.1, RT Angle, w/o Mylar, w/o Flange, 19 Circuits; Manufacturer: Molex; Manufacturer Part Number: 2086581101; Supplier: Mouser; Supplier Part Number: 538-208658-1101; RoHS: No; Category: Audio / Video Connectors; Stock: 1058; Pricing: 1=2.68, 10=2.33, 50=2.33, 100=1.79, 1000=1.79, 10000=1.44 (USD)
footprint 2086581101
pins: 1, 2, 3, 4, 5, 6, 7, 8, 9, 10, 11, 12, 13, 14, 15, 16, 17, 18, 19, SH1 SHIELD1, SH2 SHIELD2, SH3 SHIELD3, SH4 SHIELD4

## 5052783033
designator J?  (value not drawn)
Connector FFC/FPC Easy-On 30 Position 0.5mm Pitch Right Angle Surface Mount; Manufacturer: Molex; Manufacturer Part Number: 5052783033; Supplier: Digikey; Supplier Part Number: 900-5052783033CT-ND; RoHS: Yes; Category: FFC / FPC; Stock: 10945; Pricing: 1=1.21, 10=1.004, 100=0.8365, 1000=0.66919 (USD)
footprint 5052783033
pins: 1, 2, 3, 4, 5, 6, 7, 8, 9, 10, 11, 12, 13, 14, 15, 16, 17, 18, 19, 20, 21, 22, 23, 24, 25, 26, 27, 28, 29, 30, 31 SH, 32 SH

## 7499111121A
designator J?  (value not drawn)
Telecom and Datacom Connector, 8 Contact(s), Female, Right Angle, Solder Terminal; Manufacturer: Wurth Electronics; Manufacturer Part Number: 7499111121A; Connector Type: RJ45; Number of Positions: 8; Number of Ports: 1; Shielding: Shielded; Direction: Down; Value: 350uH; Pitch: 2.54mm; Supplier: Rs; Supplier Part Number: 8149926P; RoHS: Yes; Category: Uncategorized; Stock: 138; Pricing: 5=7.05, 10=6.68, 29=6.34, 58=6.03 (GBP); Mounting Technology: Through Hole; Case/Package: Metal; Contact Plating: Gold; Contact Material: Tin,Ferrite,Gold; Color: Green,Yellow,Silver; Housing Material: Thermoplastic; Min Operating Temperature: -40°C; Max Operating Temperature: 85°C; Gender: Female; Number of Rows: 1; Termination: Through Hole; Number of Contacts: 8; Series: WE-RJ45 LAN; Packaging: Rail/Tube; Number of Cores per Jack: 8; Length: 21.8mm; Width: 15.9mm; Height: 14mm; RoHS Compliant: Yes; Reach SVHC Compliant: Unknown; Lead Free: Lead Free; Flammability Rating: UL94 V-0; ComponentLink1URL: https://datasheet.ciiva.com/18490/7499111121a-18490726.pdf?src-supplier=Digi-Key; ComponentLink1Description: https://datasheet.ciiva.com/18490/7499111121a-18490726.pdf?src-supplier=Digi-Key; ComponentLink2URL: https://datasheet.ciiva.com/23946/1737253-23946370.pdf?src-supplier=Newark; ComponentLink2Description: https://datasheet.ciiva.com/23946/1737253-23946370.pdf?src-supplier=Newark; ComponentLink3URL: https://datasheet.ciiva.com/24089/7499111121a-254078-24089426.pdf?src-supplier=Mouser; ComponentLink3Description: https://datasheet.ciiva.com/24089/7499111121a-254078-24089426.pdf?src-supplier=Mouser
footprint 7499111121A
pins: 1 D1+, 2 D1-, 3 D2+, 4 D3+, 5 D3-, 6 D2-, 7 D4+, 8 D4-, 9 VCC, 10 GND, 11 Y_A, 12 Y_C, 13 G_A, 14 G_C, 15, 16, 17 SHIELD, 18 SHIELD

## 9774005360R
designator RST?  (value not drawn)
WA-SMSI SMT Steel Spacer, M3 Internal non Stop; Manufacturer: Wurth Electronics; Manufacturer Part Number: 9774005360R; Supplier: Rs; Supplier Part Number: 2302048; RoHS: No; Category: Spacers, Standoffs; Stock: 1195; Pricing: 10=0.718, 50=0.671, 200=0.641, 500=0.592 (GBP)
footprint 9774005360R
pins: 1

## 9774010243R
designator RST?  (value not drawn)
WA-SMSI SMT Steel Spacer, M2 Internal non Stop; Manufacturer: Wurth Electronics; Manufacturer Part Number: 9774010243R; L: 2.5mm; Supplier: Rs; Supplier Part Number: 1768398P; RoHS: Yes; Category: Spacers, Standoffs; Stock: 5510; Pricing: 20=0.843, 50=0.817, 100=0.703, 250=0.668 (GBP); ComponentLink1URL: http://www.mouser.com/ds/2/445/9774010243R-611450.pdf?src-supplier=Mouser; ComponentLink1Description: http://www.mouser.com/ds/2/445/9774010243R-611450.pdf?src-supplier=Mouser; ComponentLink2URL: http://www.farnell.com/datasheets/1960359.pdf?src-supplier=Farnell; ComponentLink2Description: http://www.farnell.com/datasheets/1960359.pdf?src-supplier=Farnell; ComponentLink3URL: https://media.digikey.com/pdf/Data%20Sheets/Wurth%20Electronics%20PDFs/WA-SMSx_Performance_Flyer.pdf?src-supplier=Digi-Key; ComponentLink3Description: https://media.digikey.com/pdf/Data%20Sheets/Wurth%20Electronics%20PDFs/WA-SMSx_Performance_Flyer.pdf?src-supplier=Digi-Key; ComponentLink4URL: http://www.farnell.com/datasheets/1960359.pdf?src-supplier=Newark; ComponentLink4Description: http://www.farnell.com/datasheets/1960359.pdf?src-supplier=Newark; ComponentLink5URL: https://datasheet.octopart.com/9774010243R-W%C3%BCrth-Elektronik-datasheet-48588422.pdf?src-supplier=Element14; ComponentLink5Description: https://datasheet.octopart.com/9774010243R-W%C3%BCrth-Elektronik-datasheet-48588422.pdf?src-supplier=Element14
footprint 9774010243R

## 9774015243R
designator RST?  (value not drawn)
Spacer Material: Steel, Tin-Plated Mounting: SMT Series: WA-SMST Thread D: M2; Manufacturer: Wurth Electronics; Manufacturer Part Number: 9774015243R; Supplier: Rs; Supplier Part Number: 1768362P; RoHS: Yes; Category: Spacers, Standoffs; Stock: 1630; Pricing: 20=0.844, 50=0.817, 100=0.703, 250=0.668 (GBP); ComponentLink1URL: https://media.digikey.com/pdf/Data%20Sheets/Wurth%20Electronics%20PDFs/WA-SMSx_Performance_Flyer.pdf?src-supplier=Digi-Key; ComponentLink1Description: https://media.digikey.com/pdf/Data%20Sheets/Wurth%20Electronics%20PDFs/WA-SMSx_Performance_Flyer.pdf?src-supplier=Digi-Key; ComponentLink2URL: http://www.mouser.com/ds/2/445/9774015243R-611439.pdf?src-supplier=Mouser; ComponentLink2Description: http://www.mouser.com/ds/2/445/9774015243R-611439.pdf?src-supplier=Mouser; ComponentLink3URL: http://www.farnell.com/datasheets/1960361.pdf?src-supplier=Farnell; ComponentLink3Description: http://www.farnell.com/datasheets/1960361.pdf?src-supplier=Farnell; ComponentLink4URL: http://www.farnell.com/datasheets/1960361.pdf?src-supplier=Newark; ComponentLink4Description: http://www.farnell.com/datasheets/1960361.pdf?src-supplier=Newark; ComponentLink5URL: http://www.farnell.com/datasheets/1960361.pdf?src-supplier=Element14; ComponentLink5Description: http://www.farnell.com/datasheets/1960361.pdf?src-supplier=Element14; ComponentLink6URL: https://katalog.we-online.de/em/datasheet/9774015243R.pdf?src-supplier=Digi-Key; ComponentLink6Description: https://katalog.we-online.de/em/datasheet/9774015243R.pdf?src-supplier=Digi-Key
footprint 9774015243R

## 9774015633R
designator RST?  (value not drawn)
WA-SMSI SMT Steel Spacer, M1.6 Internal non Stop; Manufacturer: Wurth Electronics; Manufacturer Part Number: 9774015633R; Plating: Tin; Threaded/Unthreaded: Threaded; Supplier: Rs; Supplier Part Number: 1854227; RoHS: No; Category: Spacers, Standoffs; Stock: 1580; Pricing: 10=0.911, 100=0.783, 250=0.717, 500=0.663, 1000=0.637 (EUR); Material: Steel; Series: WA-SMSI; ComponentLink1URL: https://www.we-online.com/catalog/datasheet/9774015633R.pdf?src-supplier=Digikey; ComponentLink1Description: https://www.we-online.com/catalog/datasheet/9774015633R.pdf?src-supplier=Digikey
footprint 9774015633R
pins: 1

## 9774025151R
designator RST?  (value not drawn)
Spacer Material: Steel Mounting: SMT Series: WA-SMSI Thread D: M2.5; Manufacturer: Wurth Electronics; Manufacturer Part Number: 9774025151R; Supplier: Rs; Supplier Part Number: 1768214P; RoHS: Yes; Category: Spacers, Standoffs; Stock: 560; Pricing: 20=1.125, 50=1.07, 100=0.914, 250=0.87 (EUR); Min Operating Temperature: -55°C; Max Operating Temperature: 150°C; Packaging: 10Packaging; Height: 2.6mm; ComponentLink1URL: http://www.mouser.com/ds/2/445/9774025151R-611453.pdf?src-supplier=Mouser; ComponentLink1Description: http://www.mouser.com/ds/2/445/9774025151R-611453.pdf?src-supplier=Mouser; ComponentLink2URL: http://www.farnell.com/datasheets/1960364.pdf?src-supplier=Farnell; ComponentLink2Description: http://www.farnell.com/datasheets/1960364.pdf?src-supplier=Farnell; ComponentLink3URL: https://media.digikey.com/pdf/Data%20Sheets/Wurth%20Electronics%20PDFs/WA-SMSx_Performance_Flyer.pdf?src-supplier=Digikey; ComponentLink3Description: https://media.digikey.com/pdf/Data%20Sheets/Wurth%20Electronics%20PDFs/WA-SMSx_Performance_Flyer.pdf?src-supplier=Digikey; ComponentLink4URL: http://www.farnell.com/datasheets/1960364.pdf?src-supplier=Newark; ComponentLink4Description: http://www.farnell.com/datasheets/1960364.pdf?src-supplier=Newark; ComponentLink5URL: http://www.farnell.com/datasheets/1960364.pdf?src-supplier=Element14; ComponentLink5Description: http://www.farnell.com/datasheets/1960364.pdf?src-supplier=Element14
footprint 9774025151R (RND STNDFF M2.5X0.45 STEEL 2.5MM)
pins: 1

## 9774025633R
designator RST?  (value not drawn)
Standoff, Round Female-female, 3.2MM; Svhc: No Svhc (15-JAN-2019); Manufacturer: Wurth Electronics; Manufacturer Part Number: 9774025633R; Supplier: Farnell; Supplier Part Number: 3105510; RoHS: No; Category: Spacers, Standoffs; Stock: 1999; Pricing: 1=1.04, 50=0.963, 100=0.886 (EUR); ComponentLink1URL: https://www.we-online.com/catalog/datasheet/9774025633R.pdf?src-supplier=Digikey; ComponentLink1Description: https://www.we-online.com/catalog/datasheet/9774025633R.pdf?src-supplier=Digikey
footprint 9774025633R
pins: 1
